# Altium schematic symbol library LATTICEPLDS_Library.SchLib: 291 symbols (part 15 of 32) (continued)
## LFE3-70EA-FN1156CES (continued)
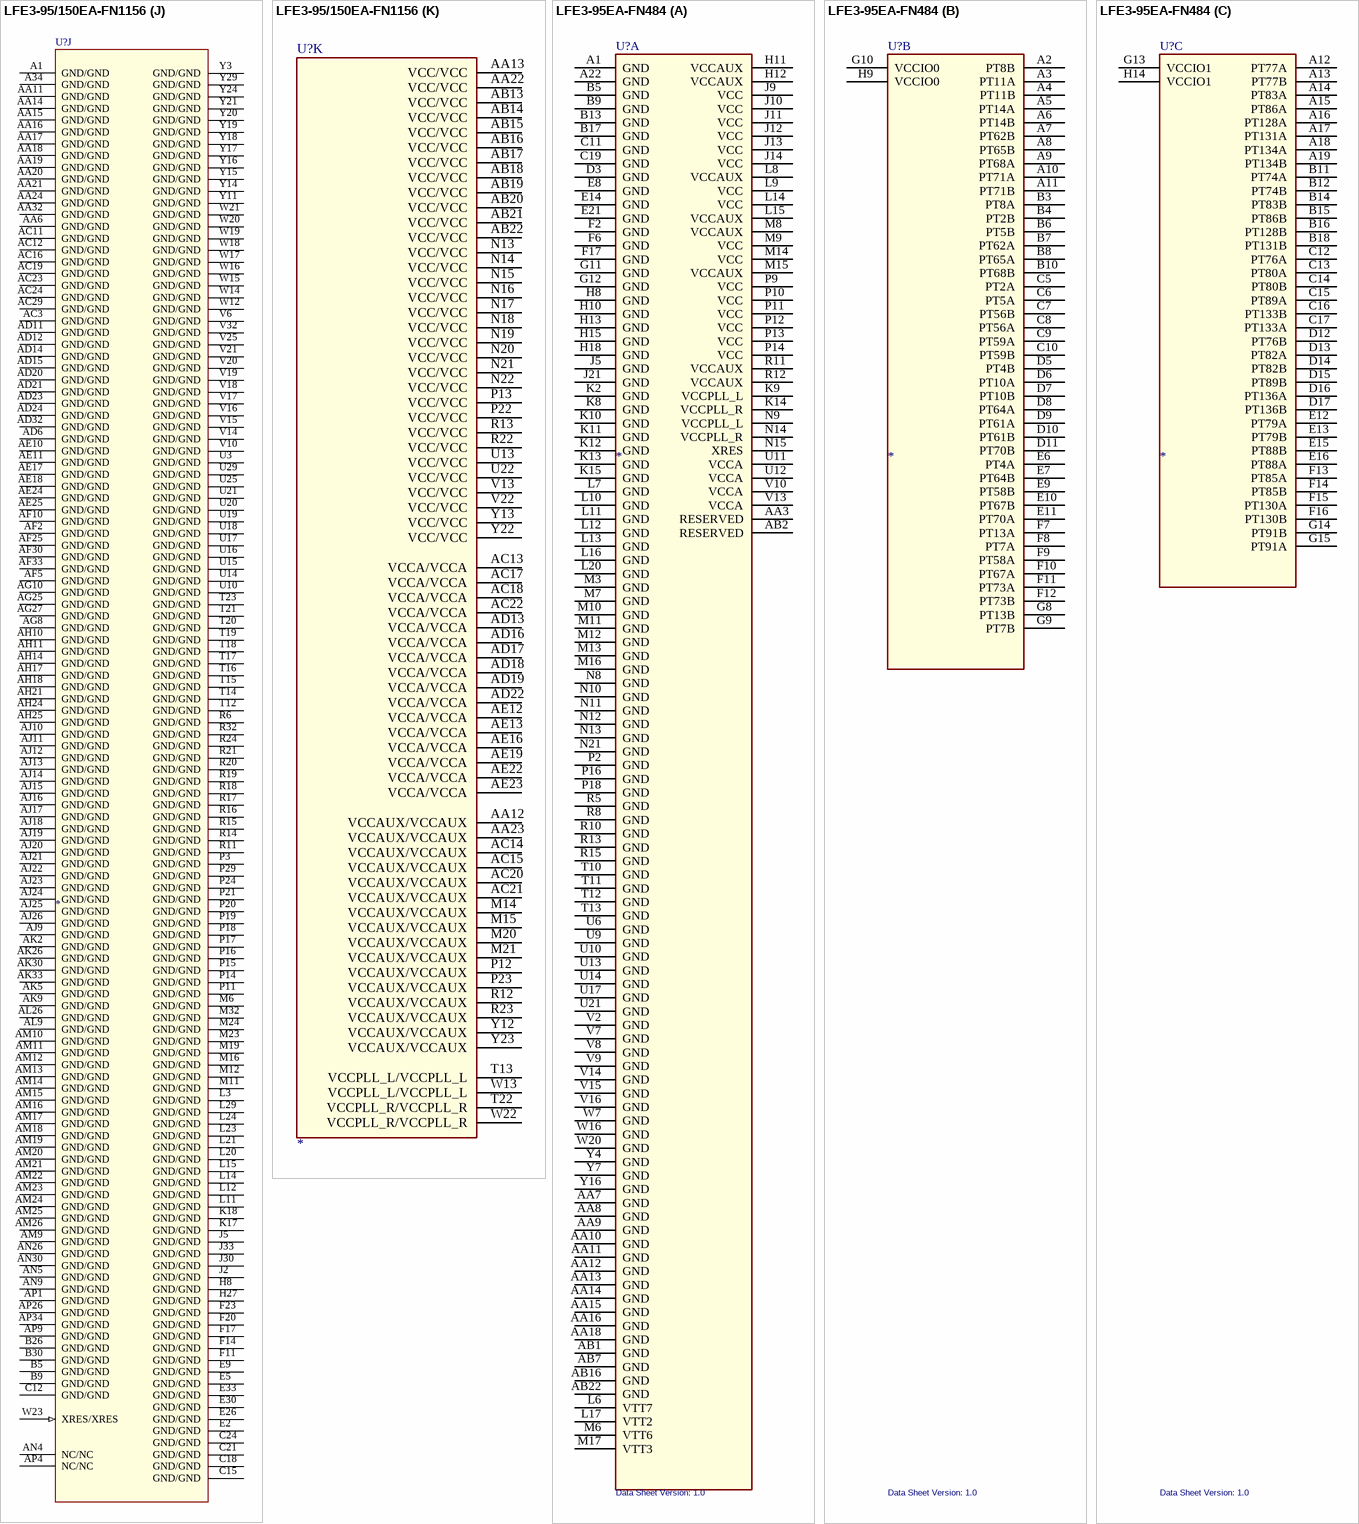
[diagram p148: symbols LFE3-95/150EA-FN1156 to LFE3-95EA-FN484]
part D text: Primary/Secondary; *=TrueLVDS
part E text: Primary/Secondary; *=TrueLVDS
part F text: Primary/Secondary; *=TrueLVDS
part G text: Primary/Secondary; *=TrueLVDS
part H text: Primary/Secondary

## LFE3-95/150EA-FN1156
designator U?
SPLIT_INST: TRUE; SWAP_INFO: (S1+S2+S3+S4+S5+S6+S7+S8+S9+S10+S11)
part A pins: A2 PT8B/PT8B (io), A3 PT11B/PT11B (io), A4 PT14A/PT14A (io), A5 PT14B/PT14B (io), A6 PT17B/PT17B (io), A7 PT16B/PT16B (io), A8 PT19A/PT19A (io), A9 PT19B/PT19B (io), A10 PT20A/PT38A (io), A11 PT26A/PT44A (io), A12 PT32A/PT50A (io), A13 PT41A/PT59A (io), A14 PT56A/PT74A (io), A15 PT62A/PT80A (io), A16 PT68A/PT86A (io), B1 PT5A/PT5A (io), B2 PT5B/PT5B (io), B3 PT8A/PT8A (io), B4 PT11A/PT11A (io), B6 PT17A/PT17A (io), B7 PT16A^/PT16A^ (io), B8 NC/PT20A (io), B10 PT20B/PT38B (io), B11 PT26B/PT44B (io), B12 PT32B/PT50B (io), B13 PT41B/PT59B (io), B14 PT56B/PT74B (io), B15 PT62B/PT80B (io), B16 PT68B/PT86B (io), C2 PT4B/PT4B/VREF2_0 (io), C3 PT2A/PT2A (io), C4 PT2B/PT2B (io), C5 PT13B/PT13B (io), C6 PT10B/PT10B (io), C8 NC/PT20B (io), C9 NC/PT26B (io), C10 PT43B/PT61B (io), C11 PT23A/PT41A (io), C13 PT44A/PT62A (io), C14 PT50A/PT68A (io), C16 PT65A/PT83A (io), C17 PT71A/PT89A (io), D3 PT4A/PT4A/VREF1_0 (io), D4 PT7B/PT7B (io), D5 PT10A/PT10A (io), D6 PT13A/PT13A (io), D9 NC/PT26A (io), D10 PT43A^/PT61A^ (io), D11 PT23B/PT41B (io), D12 PT35A/PT53A (io), D13 PT44B/PT62B (io), D14 PT50B/PT68B (io), D15 PT59A/PT77A (io), D16 PT65B/PT83B (io), D17 PT71B/PT89B (io), E4 PT7A^/PT7A^ (io), E10 PT31B/PT49B (io), E11 PT29A/PT47A (io), E12 PT35B/PT53B (io), E13 PT38A/PT56A (io), E15 PT59B/PT77B (io), E17 PT64A/PT82A (io), F10 PT31A/PT49A (io), F12 PT29B/PT47B (io), F13 PT38B/PT56B (io), F18 PT64B/PT82B (io), F19 PT70B/PT88B (io), G11 PT25A^/PT43A^ (io), G12 PT25B/PT43B (io), G13 PT40A/PT58A (io), G16 PT58A/PT76A (io), G17 PT58B/PT76B (io), G18 PT70A^/PT88A^ (io), H11 NC/PT28A (io), H12 NC/PT28B (io), H13 PT34B/PT52B (io), H14 PT40B/PT58B (io), H15 PT46B/PT64B (io), H16 PT61B/PT79B (io), H17 PT73B/PT91B/PCLKC0_0 (io), J11 NC/PT22B (io), J12 PT22A/PT40A (io), J13 PT28B/PT46B (io), J14 PT34A^/PT52A^ (io), J15 PT46A/PT64A (io), J16 PT61A^/PT79A^ (io), J17 PT73A/PT91A/PCLKT0_0 (io), K11 NC/PT22A (io), K12 PT22B/PT40B (io), K13 PT28A/PT46A (io), K14 PT37A/PT55A (io), K15 PT37B/PT55B (io), K16 PT67A/PT85A (io), L13 VCCIO0 (power), L16 PT67B/PT85B (io), L17 VCCIO0 (power), M13 VCCIO0 (power), M17 VCCIO0 (power)
part B pins: A17 PT74A/PT92A (io), A18 PT77A/PT95A (io), A19 PT83A/PT101A (io), A20 PT89A/PT107A (io), A21 PT98A/PT116A (io), A22 PT104A/PT122A (io), A23 PT110A/PT128A (io), A24 PT116A/PT134A (io), A25 PT122A/PT140A (io), A26 PT130A/PT166A (io), A27 PT130B/PT166B (io), A28 PT128B/PT164B (io), A29 PT131A/PT167A (io), A30 PT131B/PT167B (io), A31 PT134A/PT170A (io), B17 PT74B/PT92B (io), B18 PT77B/PT95B (io), B19 PT83B/PT101B (io), B20 PT89B/PT107B (io), B21 PT98B/PT116B (io), B22 PT104B/PT122B (io), B23 PT110B/PT128B (io), B24 PT116B/PT134B (io), B25 PT122B/PT140B (io), B27 NC/PT158A (io), B28 PT128A/PT164A (io), B31 PT134B/PT170B (io), C19 PT86A/PT104A (io), C20 PT95A/PT113A (io), C22 PT107A/PT125A (io), C23 PT113A/PT131A (io), C25 PT125A/PT143A (io), C26 NC/PT157A (io), C27 NC/PT158B (io), C28 PT124A^/PT142A^ (io), C29 PT136A/PT172A/VREF1_1 (io), C30 PT136B/PT172B/VREF2_1 (io), D18 PT80A/PT98A (io), D19 PT86B/PT104B (io), D20 PT95B/PT113B (io), D21 PT101A/PT119A (io), D22 PT107B/PT125B (io), D23 PT113B/PT131B (io), D24 PT119A/PT137A (io), D25 PT125B/PT143B (io), D26 NC/PT157B (io), D27 NC/PT161A (io), D28 PT124B/PT142B (io), E16 NC/PT118B (io), E18 PT80B/PT98B (io), E19 PT76A/PT94A/PCLKT1_0 (io), E20 PT76B/PT94B/PCLKC1_0 (io), E21 PT101B/PT119B (io), E22 PT112A/PT130A (io), E23 PT112B/PT130B (io), E24 PT119B/PT137B (io), E27 NC/PT161B (io), F16 NC/PT118A (io), F21 PT97A^/PT115A^ (io), F22 PT97B/PT115B (io), G19 PT82A/PT100A (io), G20 PT91A/PT109A (io), G21 PT91B/PT109B (io), G23 PT118A/PT136A (io), G25 PT127B/PT145B (io), G26 PT127A/PT145A (io), H18 PT79B/PT97B (io), H19 PT82B/PT100B (io), H20 PT103A/PT121A (io), H22 PT109B/PT127B (io), H23 PT118B/PT136B (io), H25 PT133B/PT169B (io), H26 PT133A^/PT169A^ (io), J18 PT79A^/PT97A^ (io), J19 PT88A^/PT106A^ (io), J20 PT103B/PT121B (io), J21 PT109A/PT127A (io), J22 PT106A^/PT124A^ (io), J23 PT106B/PT124B (io), K19 PT88B/PT106B (io), K20 PT85A/PT103A (io), K21 PT115B/PT133B (io), K22 PT115A^/PT133A^ (io), K23 PT121A/PT139A (io), K24 PT121B/PT139B (io), L18 VCCIO1 (power), L19 PT85B/PT103B (io), L22 VCCIO1 (power), M18 VCCIO1 (power), M22 VCCIO1 (power)
part C pins: K29 NC/PR25A* (io), K30 NC/PR25B* (io), K31 NC/PR32A (io), K32 NC/PR32B (io), K33 NC/PR17B (io), K34 NC/PR17A (io), L26 NC/PR19A* (io), L28 NC/PR28A* (io), L30 NC/PR34B* (io), L31 NC/PR20B* (io), L32 NC/PR20A* (io), L33 NC/PR23B (io), L34 NC/PR23A (io), M25 NC/PR19B* (io), M26 NC/PR22A^ (io), M27 NC/PR22B (io), M28 NC/PR28B* (io), M29 NC/PR34A* (io), M30 NC/PR26B (io), M31 NC/PR26A (io), M33 NC/PR29B* (io), M34 NC/PR29A* (io), N23 VCCIO2 (power), N24 VCCIO2 (power), N26 PR19A*/PR37A* (io), N27 PR22A^/PR40A^ (io), N28 PR22B/PR40B (io), N29 PR17B/PR35B (io), N30 PR17A/PR35A (io), N31 PR20B/PR38B* (io), N32 PR20A/PR38A* (io), N33 PR23B/PR41B (io), N34 PR23A/PR41A (io), P26 PR19B*/PR37B* (io), P27 PR25B*/PR43B* (io), P28 PR25A*/PR43A* (io), P30 PR25E_C/PR43E_C/RUM2_GPLLT_IN_A, P31 PR25E_B/PR43E_B/RUM2_GPLLT_FB_B, P32 PR25E_A/PR43E_A/RUM2_GPLLT_FB_A, P33 PR26B/PR44B (io), P34 PR26A/PR44A (io), R25 PR31B/PR49B (io), R26 PR31A^/PR49A^ (io), R27 PR28B*/PR46B* (io), R28 PR28A*/PR46A* (io), R29 PR25E_D/PR43E_D/RUM2_GPLLT_IN_B, R30 PR29B/PR47B* (io), R31 PR29A/PR47A* (io), R33 PR32B/PR50B (io), R34 PR32A/PR50A (io), T24 VTT2/VTT2 (power), T25 VTT2/VTT2 (power), T26 PR37A*/PR55A*/RUM0_GDLLT_IN_A (io), T27 PR37B*/PR55B*/RUM0_GDLLT_IN_B (io), T28 PR34B*/PR52B*/VREF2_2 (io), T29 PR34A*/PR52A*/VREF1_2 (io), T30 PR40A^/PR58A^ (io), T31 PR35B/PR53B (io), T32 PR35A/PR53A (io), T33 PR38B/PR56B*/RUM0_GDLLT_FB_B (io), T34 PR38A/PR56A*/RUM0_GDLLT_FB_A (io), U23 VCCIO2 (power), U24 VCCIO2 (power), U26 PR43A*/PR61A*/PCLKT2_0 (io), U27 PR43B*/PR61B*/PCLKC2_0 (io), U30 PR40B/PR58B (io), U31 PR41B/PR59B (io), U32 PR41A/PR59A (io), U33 PR43E_B/PR61E_B/RUM0_GPLLT_FB_B, U34 PR43E_A/PR61E_A/RUM0_GPLLT_FB_A, V33 PR43E_D/PR61E_D/RUM0_GPLLT_IN_B, V34 PR43E_C/PR61E_C/RUM0_GPLLT_IN_A
part D pins: AA25 PR64A*/PR82A* (io), AA26 PR64B*/PR82B* (io), AA27 PR70B*/PR88B* (io), AA28 PR70A*/PR88A* (io), AA29 PR58B/PR76B (io), AA30 PR65B/PR83B* (io), AA31 PR65A/PR83A* (io), AA33 PR61E_B/PR79E_B/RLM1_GPLLT_FB_B, AA34 PR61E_A/PR79E_A/RLM1_GPLLT_FB_A, AB23 VCCIO3 (power), AB24 VCCIO3 (power), AB25 NC/PR94B (io), AB26 NC/PR94A^ (io), AB27 NC/PR100B* (io), AB28 PR70E_C/PR97E_C/RLM3_GPLLT_IN_A, AB29 PR70E_D/PR97E_D/RLM3_GPLLT_IN_B, AB30 PR67A^/PR85A^ (io), AB31 NC/PR89B (io), AB32 NC/PR89A (io), AB33 PR62B/PR80B (io), AB34 PR62A/PR80A (io), AC25 NC/PR103A^ (io), AC26 NC/PR103B (io), AC28 NC/PR100A* (io), AC30 PR67B/PR85B (io), AC31 PR70E_B/PR97E_B/RLM3_GPLLT_FB_B, AC32 PR70E_A/PR97E_A/RLM3_GPLLT_FB_A, AC33 PR68B/PR86B (io), AC34 PR68A/PR86A (io), AD25 NC/PR106B* (io), AD26 NC/PR106A* (io), AD30 NC/PR91B* (io), AD31 NC/PR91A* (io), AD33 NC/PR97A* (io), AD34 NC/PR97B* (io), AE26 PB145B/PB181B (io), AE29 PR74B/PR101B* (io), AE30 PR74A/PR101A* (io), AE31 PR71B/PR98B (io), AE32 PR71A/PR98A (io), AE33 NC/PR92B* (io), AE34 NC/PR92A* (io), AF26 PB145A/PB181A (io), AF31 PR77B/PR104B (io), AF32 PR77A/PR104A (io), AF34 NC/PR95A (io), AG26 PB136B/PB172B (io), AG34 NC/PR95B (io), AH26 PB136A/PB172A (io), AH27 PB142A/PB178A (io), AH28 PB142B/PB178B (io), AH33 PR82A*/PR109A* (io), AJ27 PB139B/PB175B (io), AJ28 PB140B/PB176B (io), AJ31 PR88A*/PR115A* (io), AJ33 PR82B*/PR109B* (io), AJ34 PR79E_C/PR106E_C/RLM4_GPLLT_IN_A, AK27 PB139A/PB175A (io), AK28 PB140A/PB176A (io), AK29 PB143B/PB179B (io), AK31 PR88B*/PR115B* (io), AK32 PR86B/PR113B (io), AK34 PR79E_D/PR106E_D/RLM4_GPLLT_IN_B, AL27 PB134B/PB170B (io), AL28 PB137B/PB173B (io), AL29 PB143A/PB179A (io), AL30 PR91A*/PR118A* (io), AL31 PR95A/PR122A (io), AL32 PR86A/PR113A (io), AL33 PR85B/PR112B (io), AL34 PR85A^/PR112A^ (io), AM27 PB134A/PB170A (io), AM28 PB137A/PB173A (io), AM29 PR97A*/PR124A* (io), AM30 PR91B*/PR118B* (io), AM31 PR95B/PR122B (io), AM32 PR89B/PR116B (io), AM33 PR79E_B/PR106E_B/RLM4_GPLLT_FB_B, AM34 PR79E_A/PR106E_A/RLM4_GPLLT_FB_A, AN27 PB133B/PB169B (io), AN28 PB131B/PB167B (io), AN29 PR97B*/PR124B* (io), AN31 PR92B/PR119B* (io), AN32 PR89A/PR116A (io), AN33 PR80B/PR107B (io), AN34 PR80A/PR107A (io), AP27 PB133A/PB169A (io), AP28 PB131A/PB167A (io), AP29 PR94A^/PR121A^ (io), AP30 PR94B/PR121B (io), AP31 PR92A/PR119A* (io), AP32 PR83B/PR110B* (io), AP33 PR83A/PR110A* (io), U28 PR46A*/PR64A*/PCLKT3_0 (io), V23 VCCIO3 (power), V24 VCCIO3 (power), V26 PR49B/PR67B (io), V27 PR49A^/PR67A^ (io), V28 PR46B*/PR64B*/PCLKC3_0 (io), V29 PR52A*/PR70A*/VREF1_3 (io), V30 PR44B/PR62B (io), V31 PR44A/PR62A (io), W24 VTT3/VTT3 (power), W25 VTT3/VTT3 (power), W26 PR55B*/PR73B* (io), W27 PR55A*/PR73A* (io), W28 PR52B*/PR70B*/VREF2_3 (io), W29 PR53B/PR71B (io), W30 PR53A/PR71A (io), W31 PR50B/PR68B (io), W32 PR50A/PR68A (io), W33 PR47B/PR65B* (io), W34 PR47A/PR65A* (io), Y25 PR61B*/PR79B* (io), Y26 PR61A*/PR79A* (io), Y27 PR61E_D/PR79E_D/RLM1_GPLLT_IN_B, Y28 PR61E_C/PR79E_C/RLM1_GPLLT_IN_A, Y30 PR58A^/PR76A^ (io), Y31 PR59B/PR77B (io), Y32 PR59A/PR77A (io), Y33 PR56B/PR74B* (io), Y34 PR56A/PR74A* (io)
part E pins: AA1 PL62B/PL80B (io), AA2 PL62A/PL80A (io), AA3 PL65B/PL83B* (io), AA4 PL65A/PL83A* (io), AA5 PL70A*/PL88A* (io), AA7 PL64B*/PL82B* (io), AA8 PL61B*/PL79B* (io), AA9 NC/PL97A* (io), AA10 PL67A^/PL85A^ (io), AB1 PL68B/PL86B (io), AB2 PL68A/PL86A (io), AB3 NC/PL89B (io), AB4 NC/PL89A (io), AB5 PL70B*/PL88B* (io), AB6 NC/PL91B* (io), AB7 NC/PL91A* (io), AB8 NC/PL97B* (io), AB9 PL67B/PL85B (io), AB10 NC/PL100A* (io), AB11 VCCIO6 (power), AB12 VCCIO6 (power), AC1 NC/PL92B* (io), AC2 NC/PL92A* (io), AC4 NC/PL95B (io), AC5 NC/PL95A (io), AC6 PL70E_C/PL97E_C/LLM3_GPLLT_IN_A, AC7 PL70E_D/PL97E_D/LLM3_GPLLT_IN_B, AC8 NC/PL106B* (io), AC9 NC/PL106A* (io), AC10 NC/PL100B* (io), AD1 PL70E_B/PL97E_B/LLM3_GPLLT_FB_B, AD2 PL70E_A/PL97E_A/LLM3_GPLLT_FB_A, AD3 PL71B/PL98B (io), AD4 PL71A/PL98A (io), AD5 NC/PL94A^ (io), AD8 PL82B*/PL109B* (io), AD9 PL82A*/PL109A* (io), AD10 PB4B/PB4B (io), AE1 PL74B/PL101B* (io), AE2 PL74A/PL101A* (io), AE3 PL77B/PL104B (io), AE4 PL77A/PL104A (io), AE5 NC/PL94B (io), AE9 PB4A/PB4A (io), AF9 PB7A/PB7A (io), AG9 PB7B/PB7B (io), AH7 PB2A/PB2A (io), AH9 PB13A/PB13A (io), AJ1 NC/PL103A^ (io), AJ2 PL85A^/PL112A^ (io), AJ3 PL85B/PL112B (io), AJ4 PL88A*/PL115A* (io), AJ5 PL91A*/PL118A* (io), AJ6 PL91B*/PL118B* (io), AJ7 PB2B/PB2B (io), AJ8 PB13B/PB13B (io), AK1 NC/PL103B (io), AK3 PL86B/PL113B (io), AK4 PL88B*/PL115B* (io), AK6 PB5A/PB5A (io), AK7 PB8A/PB8A (io), AK8 PB10A/PB10A (io), AL1 PL79E_C/PL106E_C/LLM4_GPLLT_IN_A, AL2 PL79E_D/PL106E_D/LLM4_GPLLT_IN_B, AL3 PL86A/PL113A (io), AL4 PL95A/PL122A (io), AL5 PL92A/PL119A* (io), AL6 PB5B/PB5B (io), AL7 PB8B/PB8B (io), AL8 PB10B/PB10B (io), AM1 PL79E_A/PL106E_A/LLM4_GPLLT_FB_A, AM2 PL79E_B/PL106E_B/LLM4_GPLLT_FB_B, AM3 PL89B/PL116B (io), AM4 PL95B/PL122B (io), AM5 PL92B/PL119B* (io), AM6 PL94A^/PL121A^ (io), AM7 PB11A/PB11A (io), AM8 PB11B/PB11B (io), AN1 PL80A/PL107A (io), AN2 PL80B/PL107B (io), AN3 PL89A/PL116A (io), AN6 PL94B/PL121B (io), AN7 PB14A/PB14A (io), AN8 PB16A/PB16A (io), AP2 PL83A/PL110A* (io), AP3 PL83B/PL110B* (io), AP5 PL97A*/PL124A* (io), AP6 PL97B*/PL124B* (io), AP7 PB14B/PB14B (io), AP8 PB16B/PB16B (io), U1 PL44B/PL62B (io), U2 PL44A/PL62A (io), V1 PL47B/PL65B* (io), V2 PL47A/PL65A* (io), V3 PL50B/PL68B (io), V4 PL50A/PL68A (io), V5 PL49A^/PL67A^ (io), V7 PL52A*/PL70A*/VREF1_6 (io), V8 PL46B*/PL64B*/PCLKC6_0 (io), V9 PL46A*/PL64A*/PCLKT6_0 (io), V11 VCCIO6 (power), V12 VCCIO6 (power), W1 PL53B/PL71B (io), W2 PL53A/PL71A (io), W3 PL56B/PL74B* (io), W4 PL56A/PL74A* (io), W5 PL49B/PL67B (io), W6 PL58A^/PL76A^ (io), W7 PL52B*/PL70B*/VREF2_6 (io), W8 PL55A*/PL73A* (io), W9 PL55B*/PL73B* (io), W10 VTT6/VTT6 (power), W11 VTT6/VTT6 (power), Y1 PL59B/PL77B (io), Y2 PL59A/PL77A (io), Y4 PL61E_B/PL79E_B/LLM1_GPLLT_FB_B, Y5 PL61E_A/PL79E_A/LLM1_GPLLT_FB_A, Y6 PL58B/PL76B (io), Y7 PL64A*/PL82A* (io), Y8 PL61A*/PL79A* (io), Y9 PL61E_C/PL79E_C/LLM1_GPLLT_IN_A, Y10 PL61E_D/PL79E_D/LLM1_GPLLT_IN_B
part F pins: E3 PL10B*/PL10B* (io), F1 PL8B/PL8B (io), F2 PL8A/PL8A (io), F3 PL10A*/PL10A* (io), G1 PL11B/PL11B* (io), G2 PL11A/PL11A* (io), G3 PL13A^/PL13A^ (io), G4 PL2A/PL2A (io), G5 PL2B/PL2B (io), H1 PL14A/PL14A (io), H2 PL16B*/PL16B* (io), H3 PL13B/PL13B (io), H4 PL5B/PL5B (io), H5 PL5A/PL5A (io), J1 PL14B/PL14B (io), J3 PL16A*/PL16A* (io), J6 NC/PL19B* (io), K1 NC/PL20B* (io), K2 NC/PL20A* (io), K3 NC/PL17B (io), K4 NC/PL17A (io), K5 NC/PL28B* (io), K6 NC/PL28A* (io), K7 NC/PL19A* (io), K8 PL4B*/NC (io), K9 PL4A*/NC (io), L1 NC/PL23B (io), L2 NC/PL23A (io), L4 NC/PL26B (io), L5 NC/PL26A (io), L6 NC/PL34B* (io), L7 NC/PL25B* (io), L9 NC/PL22B (io), L10 NC/PL22A^ (io), M1 NC/PL32B (io), M2 NC/PL32A (io), M3 NC/PL29B* (io), M4 NC/PL29A* (io), M5 PL19A*/PL37A* (io), M7 NC/PL34A* (io), M8 NC/PL25A* (io), M9 NC/PL31B (io), M10 PL22A^/PL40A^ (io), N1 PL20B/PL38B* (io), N2 PL20A/PL38A* (io), N3 PL17B/PL35B (io), N4 PL17A/PL35A (io), N5 PL19B*/PL37B* (io), N6 PL25E_D/PL43E_D/LUM2_GPLLT_IN_B, N7 PL25E_C/PL43E_C/LUM2_GPLLT_IN_A, N8 PL25A*/PL43A* (io), N9 NC/PL31A^ (io), N10 PL22B/PL40B (io), N11 VCCIO7 (power), N12 VCCIO7 (power), P1 PL25E_B/PL43E_B/LUM2_GPLLT_FB_B, P2 PL25E_A/PL43E_A/LUM2_GPLLT_FB_A, P4 PL23B/PL41B (io), P5 PL23A/PL41A (io), P6 PL31B/PL49B (io), P7 PL31A^/PL49A^ (io), P8 PL25B*/PL43B* (io), P9 PL28A*/PL46A* (io), P10 PL28B*/PL46B* (io), R1 PL29B/PL47B* (io), R2 PL29A/PL47A* (io), R3 PL32B/PL50B (io), R4 PL32A/PL50A (io), R5 PL26B/PL44B (io), R7 PL26A/PL44A (io), R8 PL37A*/PL55A*/LUM0_GDLLT_IN_A (io), R9 PL34A*/PL52A*/VREF1_7 (io), R10 PL34B*/PL52B*/VREF2_7 (io), T1 PL41B/PL59B (io), T2 PL41A/PL59A (io), T3 PL38B/PL56B*/LUM0_GDLLT_FB_B (io), T4 PL38A/PL56A*/LUM0_GDLLT_FB_A (io), T5 PL35B/PL53B (io), T6 PL35A/PL53A (io), T7 PL37B*/PL55B*/LUM0_GDLLT_IN_B (io), T8 PL40B/PL58B (io), T9 PL40A^/PL58A^ (io), T10 VTT7/VTT7 (power), T11 VTT7/VTT7 (power), U4 PL43E_B/PL61E_B/LUM0_GPLLT_FB_B, U5 PL43E_A/PL61E_A/LUM0_GPLLT_FB_A, U6 PL43E_C/PL61E_C/LUM0_GPLLT_IN_A, U7 PL43E_D/PL61E_D/LUM0_GPLLT_IN_B, U8 PL43B*/PL61B*/PCLKC7_0 (io), U9 PL43A*/PL61A*/PCLKT7_0 (io), U11 VCCIO7 (power), U12 VCCIO7 (power)
part G pins: A32 PT140A/PT176A/XD8 (io), A33 PT140B/PT176B/XD9 (io), B32 PT143A/PT179A/XD12 (io), B33 CFG0/CFG0 (in), B34 PROGRAMN/PROGRAMN (in), C1 TDO/TDO, C31 PT145B/PT181B/XD15 (io), C32 PT143B/PT179B/XD13 (io), C33 INITN/INITN (io), C34 CCLK/CCLK (io), D1 TCK/TCK, D2 TMS/TMS, D29 PT142B/PT178B/XD11 (io), D30 PT142A/PT178A/XD10 (io), D31 PT145A/PT181A/XD14 (io), D32 CFG2/CFG2 (in), D33 PR5A/PR5A/HFP (io), D34 PR5B/PR5B/DI/CSSPI0N/CEN/CSSPIN (io), E1 TDI/TDI, E31 PR10A/PR10A/WRITEN (io), E32 PR10B/PR10B/D0/SPIFASTN (io), E34 PR8A/PR8A/DOUT/CSON/CSSPI1N (io), F30 CFG1/CFG1 (in), F31 PR7B/PR7B/CSN/SN/CONT1N/OEN (io), F32 PR16A/PR16A/D7/SPID0 (io), F33 PR16B/PR16B/BUSY/SISPI/AVDN (io), F34 PR8B/PR8B/MCLK (io), G30 PR7A/PR7A/CS1N/HOLDN/CONT2N/RDY (io), G31 DONE/DONE (io), G32 PR13B/PR13B/D4/SO (io), G33 PR13A/PR13A/D3/SI (io), G34 PR11A/PR11A/D1 (io), H33 PR11B/PR11B/D2 (io), H34 PR14A/PR14A/D5 (io), J34 PR14B/PR14B/D6/SPID1 (io), K10 VCCJ/VCCJ (power), N25 VCCIO8/VCCIO8 (power), P25 VCCIO8/VCCIO8 (power)
part H pins: AF14 PCSB_VCCIB3/PCSB_VCCIB3 (power), AF15 PCSB_VCCIB2/PCSB_VCCIB2 (power), AF16 PCSB_VCCIB1/PCSB_VCCIB1 (power), AF17 PCSB_VCCIB0/PCSB_VCCIB0 (power), AF18 PCSA_VCCIB3/PCSA_VCCIB3 (power), AF19 PCSA_VCCIB2/PCSA_VCCIB2 (power), AF20 PCSA_VCCIB1/PCSA_VCCIB1 (power), AF21 PCSA_VCCIB0/PCSA_VCCIB0 (power), AG14 PCSB_VCCOB3/PCSB_VCCOB3 (power), AG15 PCSB_VCCOB2/PCSB_VCCOB2 (power), AG16 PCSB_VCCOB1/PCSB_VCCOB1 (power), AG17 PCSB_VCCOB0/PCSB_VCCOB0 (power), AG18 PCSA_VCCOB3/PCSA_VCCOB3 (power), AG19 PCSA_VCCOB2/PCSA_VCCOB2 (power), AG20 PCSA_VCCOB1/PCSA_VCCOB1 (power), AG21 PCSA_VCCOB0/PCSA_VCCOB0 (power), AH15 PCSB_REFCLKP/PCSB_REFCLKP, AH16 PCSB_REFCLKN/PCSB_REFCLKN, AH19 PCSA_REFCLKP/PCSA_REFCLKP, AH20 PCSA_REFCLKN/PCSA_REFCLKN, AK14 PCSB_HDINN3/PCSB_HDINN3, AK15 PCSB_HDINN2/PCSB_HDINN2, AK16 PCSB_HDINN1/PCSB_HDINN1, AK17 PCSB_HDINN0/PCSB_HDINN0, AK18 PCSA_HDINN3/PCSA_HDINN3, AK19 PCSA_HDINN2/PCSA_HDINN2, AK20 PCSA_HDINN1/PCSA_HDINN1, AK21 PCSA_HDINN0/PCSA_HDINN0, AL14 PCSB_HDINP3/PCSB_HDINP3, AL15 PCSB_HDINP2/PCSB_HDINP2, AL16 PCSB_HDINP1/PCSB_HDINP1, AL17 PCSB_HDINP0/PCSB_HDINP0, AL18 PCSA_HDINP3/PCSA_HDINP3, AL19 PCSA_HDINP2/PCSA_HDINP2, AL20 PCSA_HDINP1/PCSA_HDINP1, AL21 PCSA_HDINP0/PCSA_HDINP0, AN14 PCSB_HDOUTN3/PCSB_HDOUTN3, AN15 PCSB_HDOUTN2/PCSB_HDOUTN2, AN16 PCSB_HDOUTN1/PCSB_HDOUTN1, AN17 PCSB_HDOUTN0/PCSB_HDOUTN0, AN18 PCSA_HDOUTN3/PCSA_HDOUTN3, AN19 PCSA_HDOUTN2/PCSA_HDOUTN2, AN20 PCSA_HDOUTN1/PCSA_HDOUTN1, AN21 PCSA_HDOUTN0/PCSA_HDOUTN0, AP14 PCSB_HDOUTP3/PCSB_HDOUTP3, AP15 PCSB_HDOUTP2/PCSB_HDOUTP2, AP16 PCSB_HDOUTP1/PCSB_HDOUTP1, AP17 PCSB_HDOUTP0/PCSB_HDOUTP0, AP18 PCSA_HDOUTP3/PCSA_HDOUTP3, AP19 PCSA_HDOUTP2/PCSA_HDOUTP2, AP20 PCSA_HDOUTP1/PCSA_HDOUTP1, AP21 PCSA_HDOUTP0/PCSA_HDOUTP0
part I pins: AE14 NC/PCSD_VCCOB0 (power), AE15 NC/PCSD_VCCIB0 (power), AE20 PCSC_VCCIB3/PCSC_VCCIB3 (power), AE21 PCSC_VCCOB3/PCSC_VCCOB3 (power), AF11 NC/PCSD_VCCIB3 (power), AF12 NC/PCSD_VCCIB2 (power), AF13 NC/PCSD_VCCIB1 (power), AF22 PCSC_VCCIB2/PCSC_VCCIB2 (power), AF23 PCSC_VCCIB1/PCSC_VCCIB1 (power), AF24 PCSC_VCCIB0/PCSC_VCCIB0 (power), AG11 NC/PCSD_VCCOB3 (power), AG12 NC/PCSD_VCCOB2 (power), AG13 NC/PCSD_VCCOB1 (power), AG22 PCSC_VCCOB2/PCSC_VCCOB2 (power), AG23 PCSC_VCCOB1/PCSC_VCCOB1 (power), AG24 PCSC_VCCOB0/PCSC_VCCOB0 (power), AH12 NC/PCSD_REFCLKP, AH13 NC/PCSD_REFCLKN, AH22 PCSC_REFCLKP/PCSC_REFCLKP, AH23 PCSC_REFCLKN/PCSC_REFCLKN, AK10 NC/PCSD_HDINN3, AK11 NC/PCSD_HDINN2, AK12 NC/PCSD_HDINN1, AK13 NC/PCSD_HDINN0, AK22 PCSC_HDINN3/PCSC_HDINN3, AK23 PCSC_HDINN2/PCSC_HDINN2, AK24 PCSC_HDINN1/PCSC_HDINN1, AK25 PCSC_HDINN0/PCSC_HDINN0, AL10 NC/PCSD_HDINP3, AL11 NC/PCSD_HDINP2, AL12 NC/PCSD_HDINP1, AL13 NC/PCSD_HDINP0, AL22 PCSC_HDINP3/PCSC_HDINP3, AL23 PCSC_HDINP2/PCSC_HDINP2, AL24 PCSC_HDINP1/PCSC_HDINP1, AL25 PCSC_HDINP0/PCSC_HDINP0, AN10 NC/PCSD_HDOUTN3, AN11 NC/PCSD_HDOUTN2, AN12 NC/PCSD_HDOUTN1, AN13 NC/PCSD_HDOUTN0, AN22 PCSC_HDOUTN3/PCSC_HDOUTN3, AN23 PCSC_HDOUTN2/PCSC_HDOUTN2, AN24 PCSC_HDOUTN1/PCSC_HDOUTN1, AN25 PCSC_HDOUTN0/PCSC_HDOUTN0, AP10 NC/PCSD_HDOUTP3, AP11 NC/PCSD_HDOUTP2, AP12 NC/PCSD_HDOUTP1, AP13 NC/PCSD_HDOUTP0, AP22 PCSC_HDOUTP3/PCSC_HDOUTP3, AP23 PCSC_HDOUTP2/PCSC_HDOUTP2, AP24 PCSC_HDOUTP1/PCSC_HDOUTP1, AP25 PCSC_HDOUTP0/PCSC_HDOUTP0
part J pins: A1 GND/GND (power), A34 GND/GND (power), AA6 GND/GND (power), AA11 GND/GND (power), AA14 GND/GND (power), AA15 GND/GND (power), AA16 GND/GND (power), AA17 GND/GND (power), AA18 GND/GND (power), AA19 GND/GND (power), AA20 GND/GND (power), AA21 GND/GND (power), AA24 GND/GND (power), AA32 GND/GND (power), AC3 GND/GND (power), AC11 GND/GND (power), AC12 GND/GND (power), AC16 GND/GND (power), AC19 GND/GND (power), AC23 GND/GND (power), AC24 GND/GND (power), AC29 GND/GND (power), AD6 GND/GND (power), AD11 GND/GND (power), AD12 GND/GND (power), AD14 GND/GND (power), AD15 GND/GND (power), AD20 GND/GND (power), AD21 GND/GND (power), AD23 GND/GND (power), AD24 GND/GND (power), AD32 GND/GND (power), AE10 GND/GND (power), AE11 GND/GND (power), AE17 GND/GND (power), AE18 GND/GND (power), AE24 GND/GND (power), AE25 GND/GND (power), AF2 GND/GND (power), AF5 GND/GND (power), AF10 GND/GND (power), AF25 GND/GND (power), AF30 GND/GND (power), AF33 GND/GND (power), AG8 GND/GND (power), AG10 GND/GND (power), AG25 GND/GND (power), AG27 GND/GND (power), AH10 GND/GND (power), AH11 GND/GND (power), AH14 GND/GND (power), AH17 GND/GND (power), AH18 GND/GND (power), AH21 GND/GND (power), AH24 GND/GND (power), AH25 GND/GND (power), AJ9 GND/GND (power), AJ10 GND/GND (power), AJ11 GND/GND (power), AJ12 GND/GND (power), AJ13 GND/GND (power), AJ14 GND/GND (power), AJ15 GND/GND (power), AJ16 GND/GND (power), AJ17 GND/GND (power), AJ18 GND/GND (power), AJ19 GND/GND (power), AJ20 GND/GND (power), AJ21 GND/GND (power), AJ22 GND/GND (power), AJ23 GND/GND (power), AJ24 GND/GND (power), AJ25 GND/GND (power), AJ26 GND/GND (power), AK2 GND/GND (power), AK5 GND/GND (power), AK9 GND/GND (power), AK26 GND/GND (power), AK30 GND/GND (power), AK33 GND/GND (power), AL9 GND/GND (power), AL26 GND/GND (power), AM9 GND/GND (power), AM10 GND/GND (power), AM11 GND/GND (power), AM12 GND/GND (power), AM13 GND/GND (power), AM14 GND/GND (power), AM15 GND/GND (power), AM16 GND/GND (power), AM17 GND/GND (power), AM18 GND/GND (power), AM19 GND/GND (power), AM20 GND/GND (power), AM21 GND/GND (power), AM22 GND/GND (power), AM23 GND/GND (power), AM24 GND/GND (power), AM25 GND/GND (power), AM26 GND/GND (power), AN4 NC/NC, AN5 GND/GND (power), AN9 GND/GND (power), AN26 GND/GND (power), AN30 GND/GND (power), AP1 GND/GND (power), AP4 NC/NC, AP9 GND/GND (power), AP26 GND/GND (power), AP34 GND/GND (power), B5 GND/GND (power), B9 GND/GND (power), B26 GND/GND (power), B30 GND/GND (power), C12 GND/GND (power), C15 GND/GND (power), C18 GND/GND (power), C21 GND/GND (power), C24 GND/GND (power), E2 GND/GND (power), E5 GND/GND (power), E9 GND/GND (power), E26 GND/GND (power), E30 GND/GND (power), E33 GND/GND (power), F11 GND/GND (power), F14 GND/GND (power), F17 GND/GND (power), F20 GND/GND (power), F23 GND/GND (power), H8 GND/GND (power), H27 GND/GND (power), J2 GND/GND (power), J5 GND/GND (power), J30 GND/GND (power), J33 GND/GND (power), K17 GND/GND (power), K18 GND/GND (power), L3 GND/GND (power), L11 GND/GND (power), L12 GND/GND (power), L14 GND/GND (power), L15 GND/GND (power), L20 GND/GND (power), L21 GND/GND (power), L23 GND/GND (power), L24 GND/GND (power), L29 GND/GND (power), M6 GND/GND (power), M11 GND/GND (power), M12 GND/GND (power), M16 GND/GND (power), M19 GND/GND (power), M23 GND/GND (power), M24 GND/GND (power), M32 GND/GND (power), P3 GND/GND (power), P11 GND/GND (power), P14 GND/GND (power), P15 GND/GND (power), P16 GND/GND (power), P17 GND/GND (power), P18 GND/GND (power), P19 GND/GND (power), P20 GND/GND (power), P21 GND/GND (power), P24 GND/GND (power), P29 GND/GND (power), R6 GND/GND (power), R11 GND/GND (power), R14 GND/GND (power), R15 GND/GND (power), R16 GND/GND (power), R17 GND/GND (power), R18 GND/GND (power), R19 GND/GND (power), R20 GND/GND (power), R21 GND/GND (power), R24 GND/GND (power), R32 GND/GND (power), T12 GND/GND (power), T14 GND/GND (power), T15 GND/GND (power), T16 GND/GND (power), T17 GND/GND (power), T18 GND/GND (power), T19 GND/GND (power), T20 GND/GND (power), T21 GND/GND (power), T23 GND/GND (power), U3 GND/GND (power), U10 GND/GND (power), U14 GND/GND (power), U15 GND/GND (power), U16 GND/GND (power), U17 GND/GND (power), U18 GND/GND (power), U19 GND/GND (power), U20 GND/GND (power), U21 GND/GND (power), U25 GND/GND (power), U29 GND/GND (power), V6 GND/GND (power), V10 GND/GND (power), V14 GND/GND (power), V15 GND/GND (power), V16 GND/GND (power), V17 GND/GND (power), V18 GND/GND (power), V19 GND/GND (power), V20 GND/GND (power), V21 GND/GND (power), V25 GND/GND (power), V32 GND/GND (power), W12 GND/GND (power), W14 GND/GND (power), W15 GND/GND (power), W16 GND/GND (power), W17 GND/GND (power), W18 GND/GND (power), W19 GND/GND (power), W20 GND/GND (power), W21 GND/GND (power), W23 XRES/XRES (in), Y3 GND/GND (power), Y11 GND/GND (power), Y14 GND/GND (power), Y15 GND/GND (power), Y16 GND/GND (power), Y17 GND/GND (power), Y18 GND/GND (power), Y19 GND/GND (power), Y20 GND/GND (power), Y21 GND/GND (power), Y24 GND/GND (power), Y29 GND/GND (power)
part K pins: AA12 VCCAUX/VCCAUX (power), AA13 VCC/VCC (power), AA22 VCC/VCC (power), AA23 VCCAUX/VCCAUX (power), AB13 VCC/VCC (power), AB14 VCC/VCC (power), AB15 VCC/VCC (power), AB16 VCC/VCC (power), AB17 VCC/VCC (power), AB18 VCC/VCC (power), AB19 VCC/VCC (power), AB20 VCC/VCC (power), AB21 VCC/VCC (power), AB22 VCC/VCC (power), AC13 VCCA/VCCA (power), AC14 VCCAUX/VCCAUX (power), AC15 VCCAUX/VCCAUX (power), AC17 VCCA/VCCA (power), AC18 VCCA/VCCA (power), AC20 VCCAUX/VCCAUX (power), AC21 VCCAUX/VCCAUX (power), AC22 VCCA/VCCA (power), AD13 VCCA/VCCA (power), AD16 VCCA/VCCA (power), AD17 VCCA/VCCA (power), AD18 VCCA/VCCA (power), AD19 VCCA/VCCA (power), AD22 VCCA/VCCA (power), AE12 VCCA/VCCA (power), AE13 VCCA/VCCA (power), AE16 VCCA/VCCA (power), AE19 VCCA/VCCA (power), AE22 VCCA/VCCA (power), AE23 VCCA/VCCA (power), M14 VCCAUX/VCCAUX (power), M15 VCCAUX/VCCAUX (power), M20 VCCAUX/VCCAUX (power), M21 VCCAUX/VCCAUX (power), N13 VCC/VCC (power), N14 VCC/VCC (power), N15 VCC/VCC (power), N16 VCC/VCC (power), N17 VCC/VCC (power), N18 VCC/VCC (power), N19 VCC/VCC (power), N20 VCC/VCC (power), N21 VCC/VCC (power), N22 VCC/VCC (power), P12 VCCAUX/VCCAUX (power), P13 VCC/VCC (power), P22 VCC/VCC (power), P23 VCCAUX/VCCAUX (power), R12 VCCAUX/VCCAUX (power), R13 VCC/VCC (power), R22 VCC/VCC (power), R23 VCCAUX/VCCAUX (power), T13 VCCPLL_L/VCCPLL_L (power), T22 VCCPLL_R/VCCPLL_R (power), U13 VCC/VCC (power), U22 VCC/VCC (power), V13 VCC/VCC (power), V22 VCC/VCC (power), W13 VCCPLL_L/VCCPLL_L (power), W22 VCCPLL_R/VCCPLL_R (power), Y12 VCCAUX/VCCAUX (power), Y13 VCC/VCC (power), Y22 VCC/VCC (power), Y23 VCCAUX/VCCAUX (power)
part A text: BANK 0; 95/150; *=TLVDS; ^=DQS
part B text: BANK 1; 95/150; ^=DQS
part C text: BANK 2; 95/150; *=TLVDS; ^=DQS
part D text: BANK 3; 95/150; *=TLVDS; ^=DQS
part E text: BANK 6; 95/150; *=TLVDS; ^=DQS
part F text: BANK 7; 95/150; *=TLVDS; ^=DQS
part G text: BANK 8
part H text: SERDES Quads A & B
part I text: SERDES Quads C & D

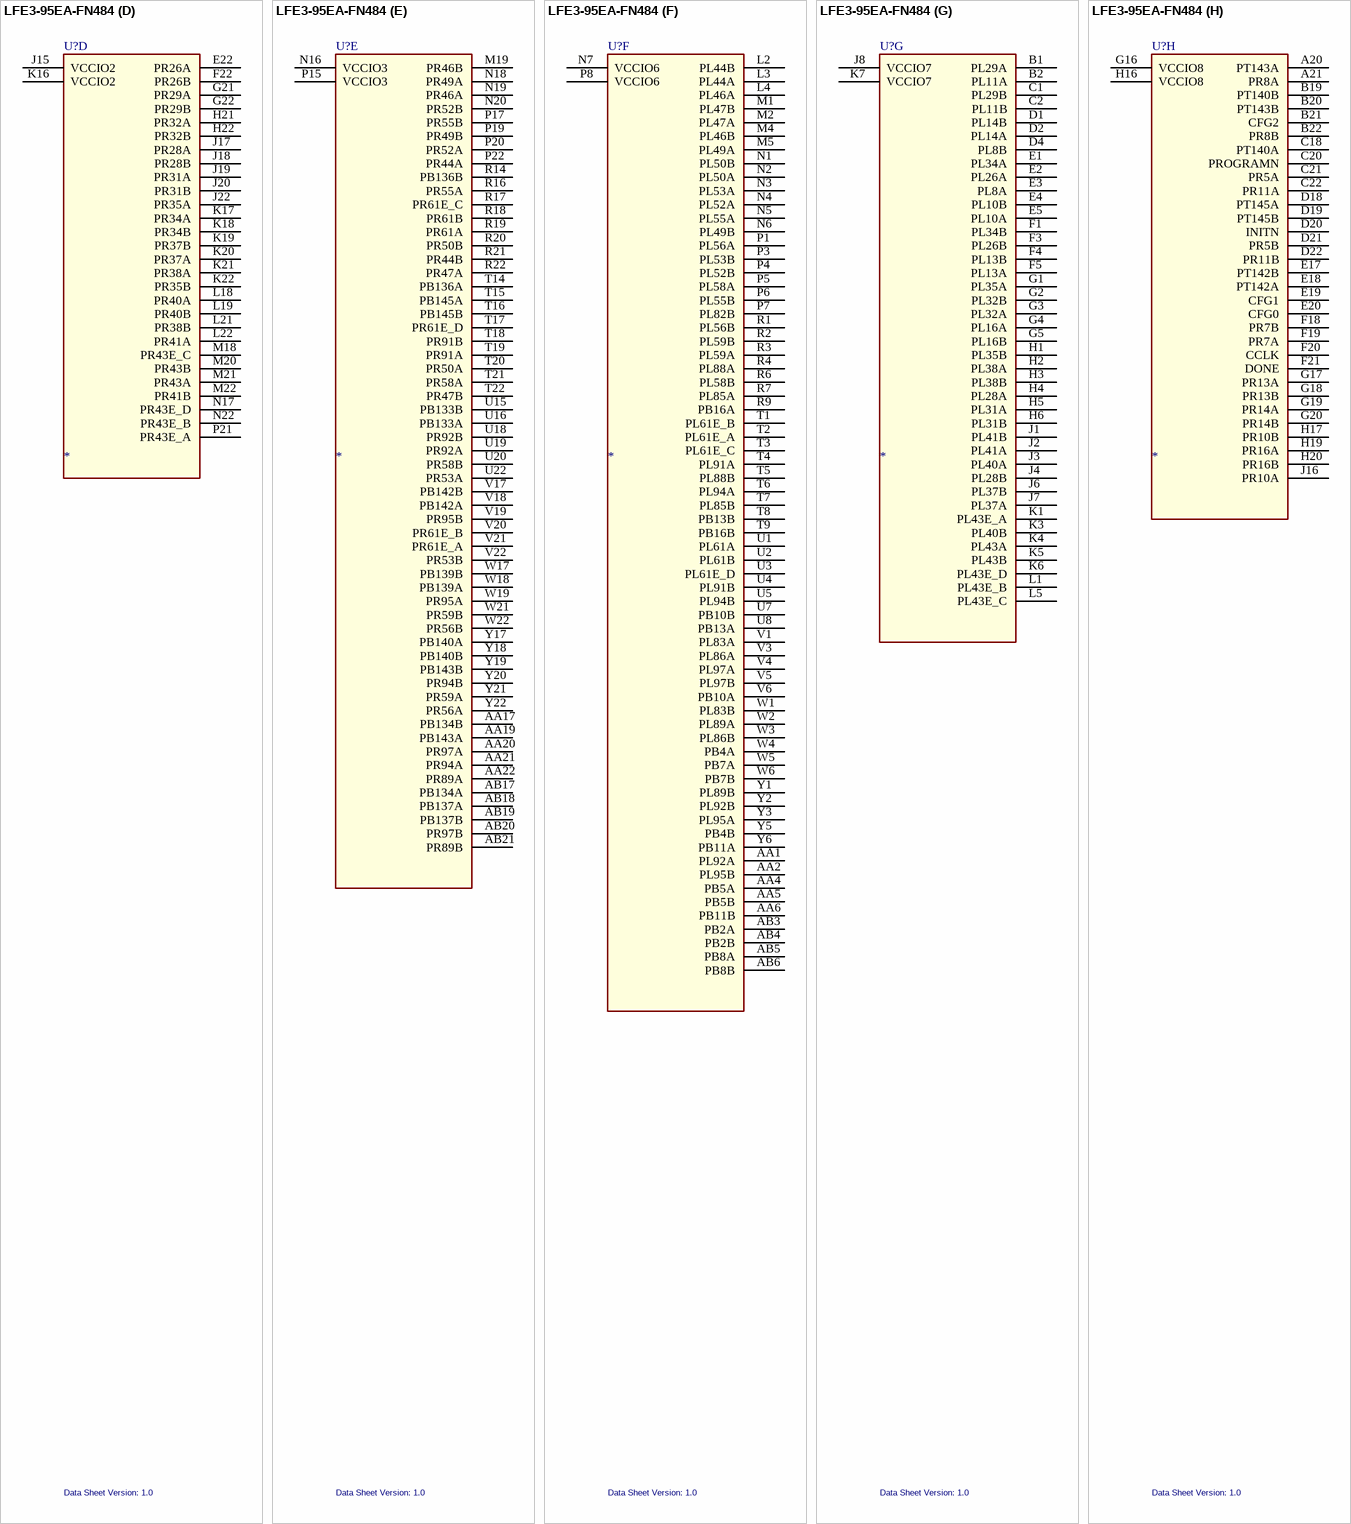
[diagram p149: symbol LFE3-95EA-FN484]

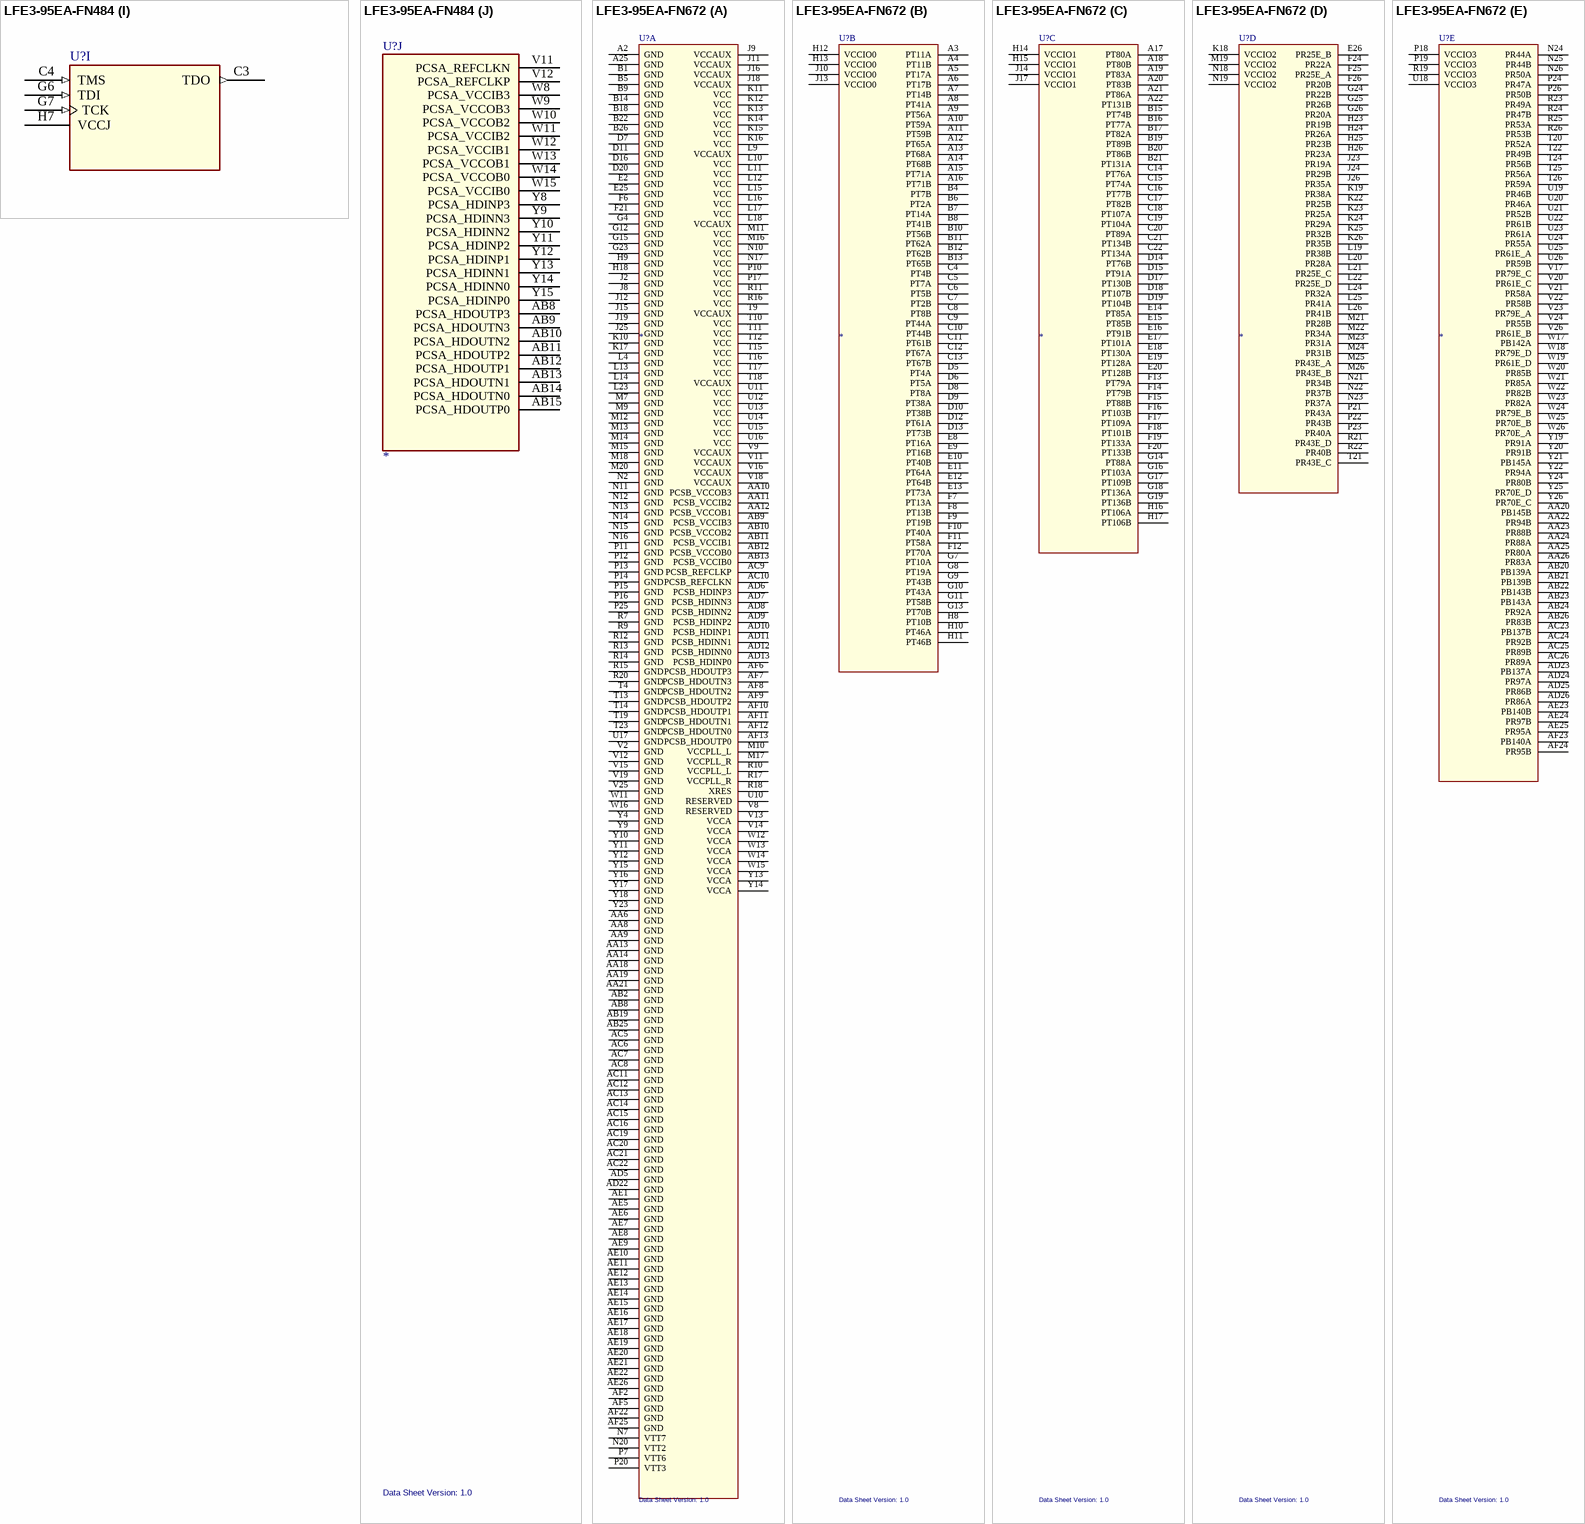
[diagram p150: symbols LFE3-95EA-FN484 to LFE3-95EA-FN672]